# Altium footprint library PcbLib1.PcbLib: 15 footprints
Each footprint in its own frame and in the unit in brackets; x right, y up, seen from the top. Pads: shape width x height; smd on the part's side, far side on the other; paste and mask are expansions set on the pad; w line width, h text height; cw(c..) or ccw(c..) is an arc to the next point about the centre after c.
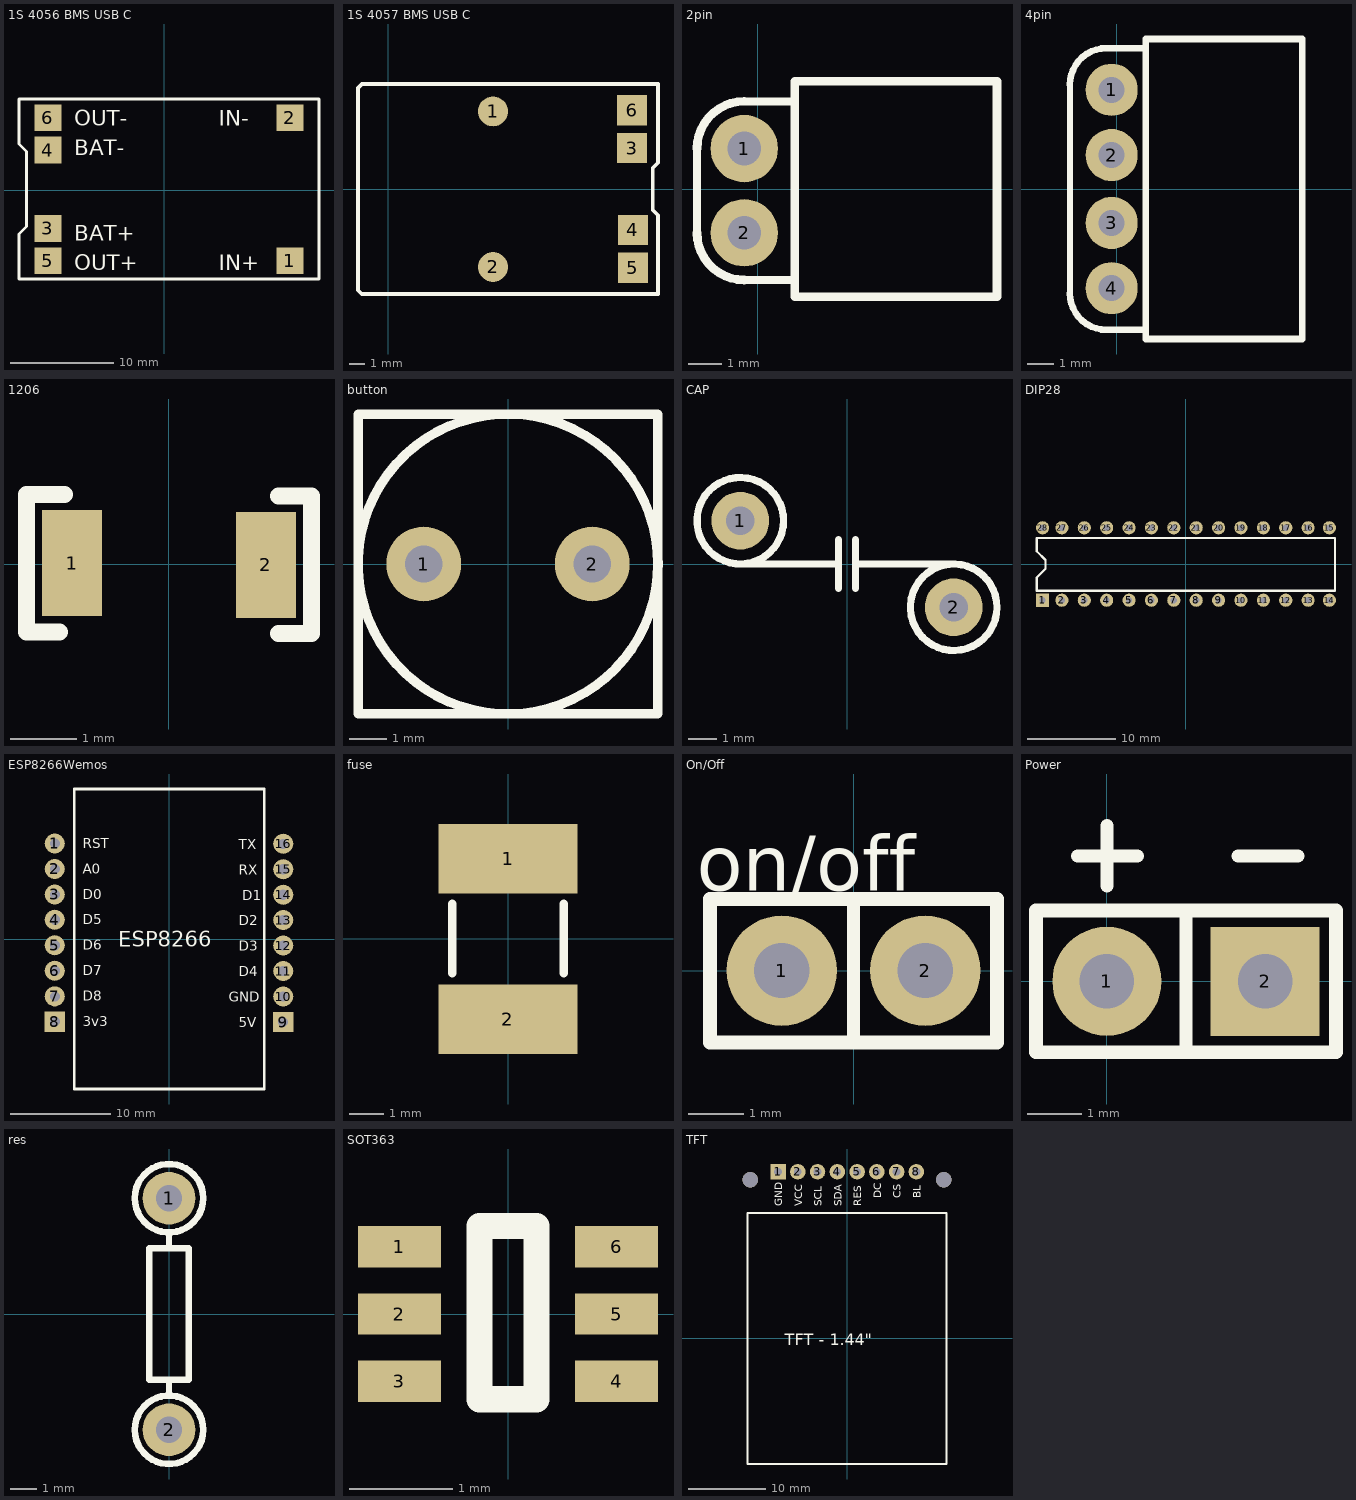
[diagram p0: the footprints below, top view; thin cyan lines are the x and y axes]

## 1S 4056 BMS USB C [mm]
pads (6):
  rect 2.6x2.6 smd: 1(12.15,-6.825) 2(12.15,7.025) 3(-11.3,-3.7) 4(-11.3,3.9) 5(-11.3,-6.825) 6(-11.3,7.025)
Top Overlay:
  lines w0.254: -14.1,-8.6 -14.1,-4.237 -13.375,-3.512 -13.375,3.762 -14.1,4.487 -14.1,8.85 14.975,8.85 14.975,-8.6 -14.1,-8.6
  text "OUT+" at -8.746,-7.746 h1.52
  text "OUT-" at -8.746,6.254 h1.52
  text "BAT-" at -8.746,3.379 h1.52
  text "BAT+" at -8.746,-4.871 h1.52
  text "IN+" at 5.254,-7.746 h1.52
  text "IN-" at 5.254,6.254 h1.52
3D body "1S 4056 BMS USB C Module 01b.step": height 5.26, standoff 0.4, extent -14.115,-8.55 14.965,8.75

## 1S 4057 BMS USB C [mm]
pads (6):
  round 2 smd: 1(7,5.175) 2(7,-5.2)
  rect 2x2 smd: 3(16.275,2.725) 4(16.325,-2.725) 5(16.325,-5.25) 6(16.275,5.25)
Top Overlay:
  lines w0.254: -2,-6.75 -1.75,-7 18,-7 18,-3.5 18,-1.75 17.65,-1.4 17.65,1.4 18,1.75 18,3.5 18,7 -1.725,7 -2,6.725 -2,-6.75
3D body "Charging Module TP4057 Mini.step": height 4.21, standoff -0.05, extent -1,-6 17,6

## 2pin [mm]
pads (2):
  round 2 hole 1: 1(-0.4,1.2) 2(-0.4,-1.3)
Top Overlay:
  lines w0.24: -1.8,-1.3 -1.8,1.2 ; -0.4,-2.7 1,-2.7 ; -0.4,2.6 1.1,2.6
  lines w0.254: -1.8,-1.3 ccw(c-0.4,-1.3) -0.4,-2.7 ; -1.8,1.2 cw(c-0.4,1.2) -0.4,2.6 ; 1.1,-3.2 7.1,-3.2 7.1,3.2 1.1,3.2 1.1,-3.2
3D body "JST - XH - Thru (R) - 2Pin - 2.54mm.stp": height 6.84, standoff -2.38, extent -0.503,-3.607 7.534,3.607

## 4pin [mm]
pads (4):
  round 2 hole 1: 1(-0.2,3.8) 2(-0.2,1.3) 3(-0.2,-1.3) 4(-0.2,-3.8)
Top Overlay:
  lines w0.24: -1.8,-4.1 -1.8,4 ; -0.4,-5.4 1,-5.4 ; -0.4,5.4 1.1,5.4
  lines w0.254: -1.8,-4 ccw(c-0.4,-4) -0.4,-5.4 ; -1.8,4 cw(c-0.4,4) -0.4,5.4 ; 1.1,-5.75 7.1,-5.75 7.1,5.75 1.1,5.75 1.1,-5.75
3D body "JST - XH - Thru (R) - 4Pin - 2.54mm.stp": height 5.84, standoff -3.38, extent -0.503,-6.147 7.534,6.147

## 1206 [mm]
pads (2):
  rect 0.9x1.6 smd: 1(-1.462,0.013) 2(1.463,-0.012)
Top Overlay:
  lines w0.254: -2.15,-1.025 -1.65,-1.025 ; -2.15,-1 -2.15,1.05 -1.575,1.05 ; 1.65,-1.05 2.15,-1.05 2.15,1.025 1.65,1.025
3D body "1206 кондёр.x_b": height 1.61, standoff 0.01, extent -1.562,-0.737 1.538,0.763

## button [mm]
pads (2):
  round 2 hole 1: 1(-2.25,0) 2(2.25,0)
Top Overlay:
  circle w0.254: c0,0 r4.005
  lines w0.254: -4,-4 4,-4 4,4 -4,4 -4,-4

## CAP [mm]
pads (2):
  round 2 hole 1: 1(-3.7,1.5) 2(3.7,-1.5)
Top Overlay:
  circle w0.254: c3.7,-1.5 r1.5
  circle w0.254: c-3.7,1.5 r1.5
  lines w0.24: -3.7,0 -0.3,0 ; -0.3,-0.85 -0.3,0.85 ; 0.3,-0.85 0.3,0.85 ; 0.3,0 3.7,0
3D body "cdisk_p7-5x3_d7_th3-5.stp": height 9, standoff -4, extent -4.375,-2.125 4.375,2.125

## DIP28 [mm]
pads (28):
  rect 1.5x1.5 hole 0.7: 1(-16.325,-4.075)
  round 1.5 hole 0.7: 2(-14.125,-4.075) 3(-11.575,-4.075) 4(-9.025,-4.075) 5(-6.475,-4.075) 6(-3.925,-4.075) 7(-1.375,-4.075) 8(1.175,-4.075) 9(3.725,-4.075) 10(6.275,-4.075) 11(8.825,-4.075) 12(11.375,-4.075) 13(13.925,-4.075) 14(16.35,-4.075) 15(16.35,4.175) 16(13.925,4.175) 17(11.375,4.175) 18(8.825,4.175) 19(6.275,4.175) 20(3.725,4.175) 21(1.175,4.175) 22(-1.375,4.175) 23(-3.925,4.175) 24(-6.475,4.175) 25(-9.025,4.175) 26(-11.575,4.175) 27(-14.125,4.175) 28(-16.325,4.175)
Top Overlay:
  lines w0.254: -17,-3 17,-3 17,3 -17,3 -17,1.5 -16,0.5 -16,-0.5 -17,-1.5 -17,-3
3D body "ATMega328.SLDPRT": height 5.03, standoff -2.61, extent -17.27,-4.259 17.27,4.259

## ESP8266Wemos [mm]
pads (16):
  round 2 hole 1: 1(-11.45,9.55) 2(-11.45,7) 3(-11.45,4.45) 4(-11.45,1.925) 5(-11.45,-0.625) 6(-11.45,-3.175) 7(-11.45,-5.735) 10(11.4,-5.75) 11(11.4,-3.2) 12(11.4,-0.65) 13(11.4,1.9) 14(11.4,4.425) 15(11.4,6.975) 16(11.4,9.525)
  rect 2x2 hole 1: 8(-11.45,-8.275) 9(11.4,-8.3)
Top Overlay:
  lines w0.254: -9.5,-15 9.5,-15 9.5,15 -9.5,15 -9.5,-15
  text "ESP8266" at -5.078,-0.762 h1.52
  text "5V" at 6.954,-8.846 h1
  text "GND" at 5.954,-6.296 h1
  text "D4" at 6.954,-3.746 h1
  text "D3" at 6.954,-1.196 h1
  text "D2" at 6.954,1.354 h1
  text "D1" at 7.287,3.879 h1
  text "RX" at 6.954,6.429 h1
  text "TX" at 6.954,8.979 h1
  text "3v3" at -8.67,-8.729 h1
  text "D8" at -8.67,-6.189 h1
  text "D7" at -8.67,-3.629 h1
  text "D6" at -8.67,-1.079 h1
  text "D5" at -8.67,1.471 h1
  text "D0" at -8.67,3.996 h1
  text "A0" at -8.67,6.546 h1
  text "RST" at -8.67,9.096 h1
3D body "wemos-mini-d1.stp": height 7.94, standoff -7, extent -12.9,-17.15 12.9,17.15

## fuse [mm]
pads (2):
  rect 4x2 smd: 1(0,2.3) 2(-0.003,-2.326)
Top Overlay:
  lines w0.24: -1.6,-1 -1.6,1 ; 1.6,-1 1.6,1
3D body "SMD Sicherung.step": height 0.6, standoff -0.01, extent -1.6,-2.275 1.6,2.275

## On/Off [mm]
pads (2):
  round 2 hole 1: 1(-1.3,0) 2(1.3,0)
Top Overlay:
  lines w0.24: 0,-1.3 0,1.3
  lines w0.254: -2.6,-1.3 2.6,-1.3 2.6,1.3 -2.6,1.3 -2.6,-1.3
  text "on/off" at -2.836,1.446 h1

## Power [mm]
pads (2):
  round 2 hole 1: 1(0,0)
  rect 2x2 hole 1: 2(2.9,0)
Top Overlay:
  lines w0.24: -0.542,2.3 0.558,2.3 ; 0,1.752 0,2.852 ; 1.45,-1.3 1.45,1.3 ; 2.4,2.3 3.5,2.3
  lines w0.254: -1.3,-1.3 4.2,-1.3 4.2,1.3 -1.3,1.3 -1.3,-1.3

## res [mm]
pads (2):
  round 2 hole 1: 1(0,4.4) 2(0,-4.4)
Top Overlay:
  circle w0.254: c0,4.4 r1.3
  circle w0.254: c0,-4.4 r1.3
  lines w0.24: 0,-3.1 0,-2.5 ; 0,2.5 0,3.1
  lines w0.254: -0.75,-2.5 0.75,-2.5 0.75,2.5 -0.75,2.5 -0.75,-2.5
3D body "Resistor.STEP": height 2.99, standoff -4, extent -1,-4.682 1,4.682

## SOT363 [mm]
pads (6):
  rect 0.8x0.4 smd: 1(-1.05,0.65) 2(-1.05,0) 3(-1.05,-0.65) 4(1.05,-0.65) 5(1.05,0) 6(1.05,0.65)
Top Overlay:
  lines w0.254: -0.275,-0.825 0.275,-0.825 0.275,0.85 -0.275,0.85 -0.275,-0.825
3D body "SOT363-2.STEP": height 1.1, standoff 0, extent -1.188,-1.107 1.212,1.093

## TFT [mm]
pads (8):
  rect 2x2 hole 1: 1(-8.9,21.5)
  round 2 hole 1: 2(-6.35,21.5) 3(-3.8,21.5) 4(-1.25,21.5) 5(1.3,21.5) 6(3.85,21.5) 7(6.4,21.5) 8(8.95,21.5)
via 12.5,20.5 diameter 2 hole 2
via -12.5,-21 diameter 2 hole 2
via 12.5,-21 diameter 2 hole 2
via -12.5,20.5 diameter 2 hole 2
Top Overlay:
  lines w0.254: -12.85,-16.2 12.85,-16.2 12.85,16.2 -12.85,16.2 -12.85,-16.2
  text "TFT - 1.44\"" at -7.998,-0.889 h1.52
  text "GND" at -8.354,17.054 h1
  text "VCC" at -5.804,17.054 h1
  text "SCL" at -3.254,17.054 h1
  text "SDA" at -0.704,17.054 h1
  text "RES" at 1.846,17.054 h1
  text "DC" at 4.396,18.054 h1
  text "CS" at 6.946,18.054 h1
  text "BL" at 9.496,18.054 h1
3D body "ER-TFTM1.44-2.STEP": height 7.2, standoff -4.9, extent -15,-23.5 15,23